# Altium footprint library common.PcbLib: 552 footprints (part 14 of 35)
Each footprint in its own frame and in the unit in brackets; x right, y up, seen from the top. Pads: shape width x height; smd on the part's side, far side on the other; paste and mask are expansions set on the pad; w line width, h text height; cw(c..) or ccw(c..) is an arc to the next point about the centre after c.
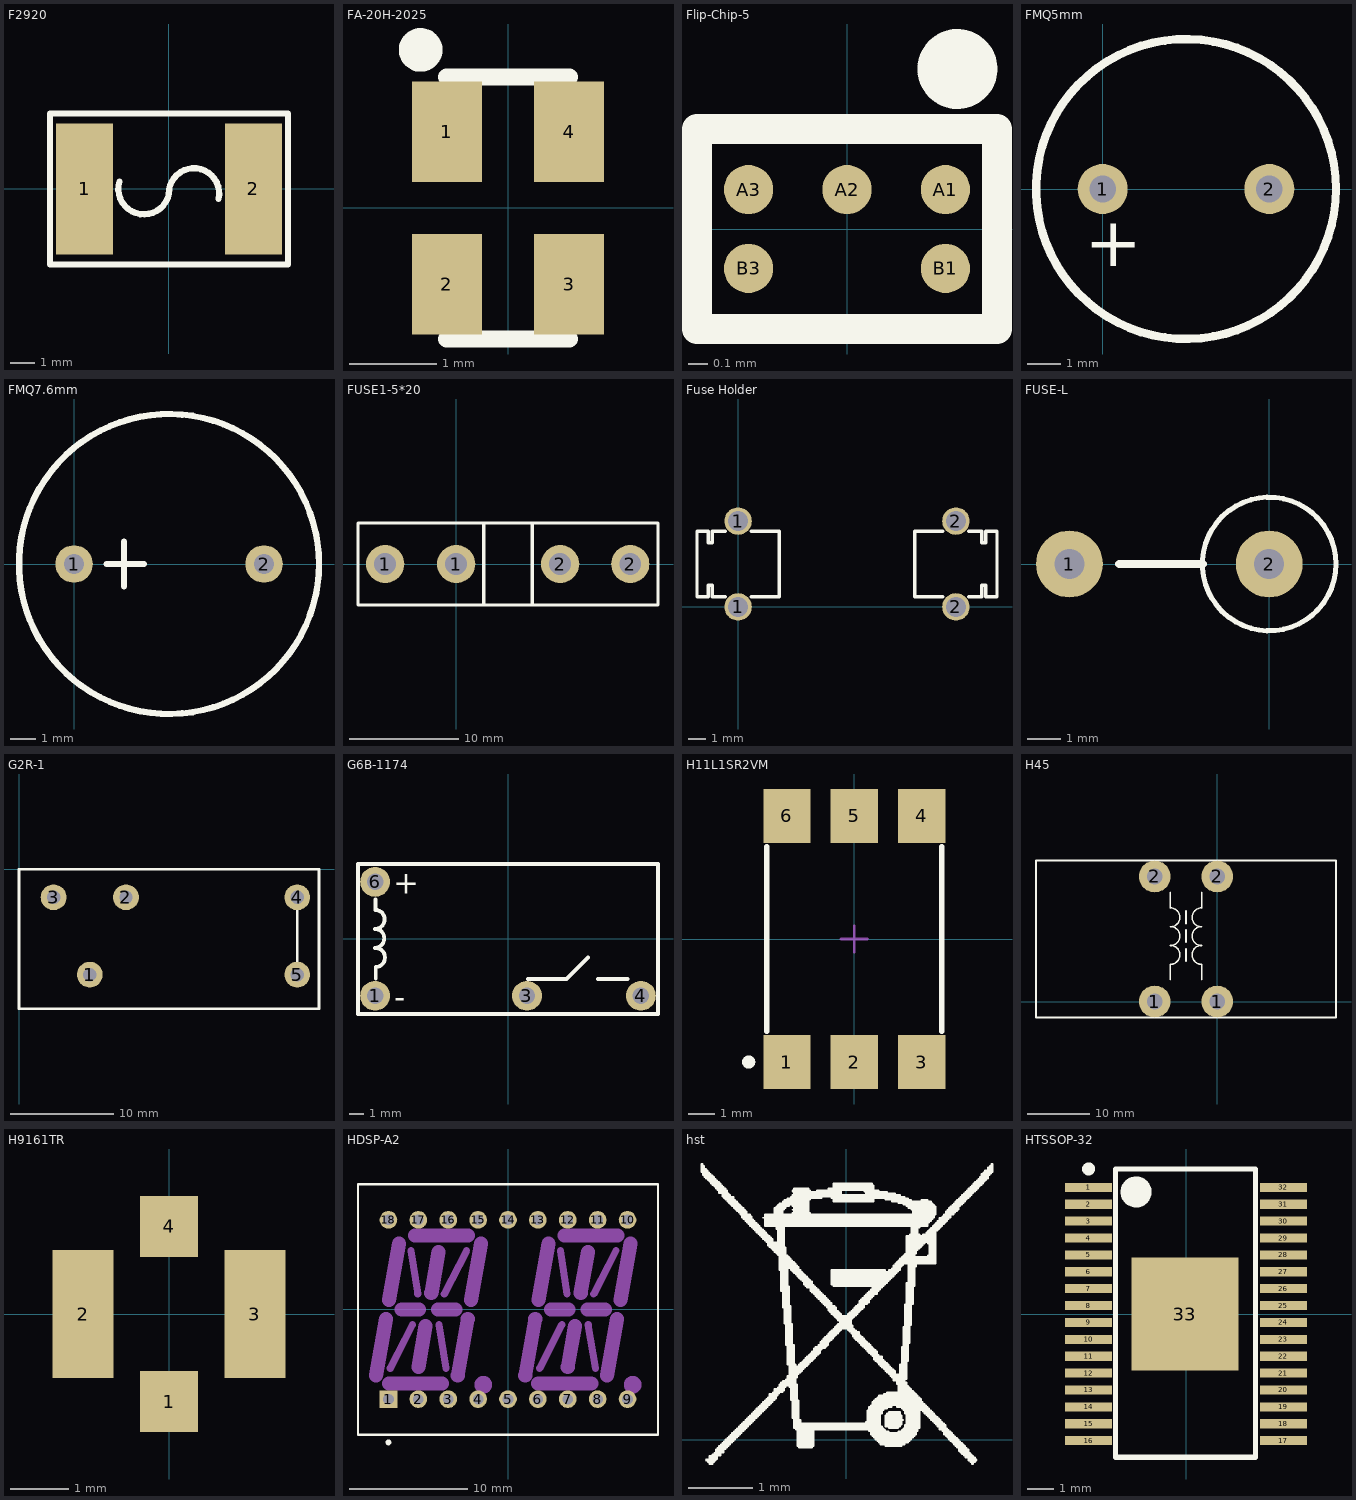
[diagram p13: the footprints below, top view; thin cyan lines are the x and y axes]

## F2920 [mm] "7452"
pads (2):
  rect 2.3x5.3 smd: 1(-3.4,0) 2(3.4,0)
Top Overlay:
  lines w0.254: -2,0.3 ccw(c-1.012,0.007) 0.018,0 ; -0.009,-0.2 cw(c1.008,-0.178) 2,-0.4 ; -4.8,-3.048 -4.8,3.048 4.8,3.048 4.8,-3.048 -4.8,-3.048
3D body: height 1, standoff 0, extent -2.878,-2.718 3.18,2.667
3D body: height 1, standoff 0, extent -3.576,-2.718 -2.878,2.667
3D body: height 1, standoff 0, extent 2.7,-2.692 3.399,2.692

## FA-20H-2025 [mm]
height 0.5
pads (4):
  rect 0.8x1.15 smd: 1(-0.7,0.875) 2(-0.7,-0.875) 3(0.7,-0.875) 4(0.7,0.875)
Top Overlay:
  circle w0.25: c-1,1.81 r0.125
  lines w0.2: -0.7,-1.5 0.7,-1.5 ; -0.7,1.5 0.7,1.5
3D body: height 0.5, standoff 0, extent -1.005,-1.25 0.995,1.25

## Flip-Chip-5 [mm]
height 0.69
pads (5):
  round 0.25 smd mask+0.05: A1(0.5,0.2) A2(0,0.2) A3(-0.5,0.2) B1(0.5,-0.2) B3(-0.5,-0.2)
Top Overlay:
  circle w0.203: c0.561,0.813 r0.102
  lines w0.152: -0.762,-0.508 -0.762,0.508 0.762,0.508 0.762,-0.508 -0.762,-0.508
3D body: height 0.69, standoff 0, extent -0.693,-0.425 0.693,0.43

## FMQ5mm [mm]
pads (2):
  round 1.5 hole 0.8: 1(0,0) 2(5,0)
Top Overlay:
  circle w0.254: c2.5,0 r4.5
  text "+" at -0.533,-2.311 h1.5
3D body: height 4.5, standoff -4.5, extent -2,-4.5 7,4.5

## FMQ7.6mm [mm]
pads (2):
  round 1.5 hole 0.8: 1(0,0) 2(7.6,0)
Top Overlay:
  circle w0.254: c3.799,0 r6.001
  lines w0.254: 1.3,0 2.8,0 ; 2,-0.9 2,0.9
3D body: height 9.65, standoff -4.5, extent -5.727,-6 9.727,6

## FUSE1-5*20 [mil]
pads (4):
  round 138 hole 79: 1(-256,0) 1(0,0) 2(375,0) 2(628,0)
Top Overlay:
  lines w12: 99,-148 99,148 ; 274,-148 274,148 ; -354,-148 728,-148 728,148 -354,148 -354,-148
3D body: height 374.02, standoff -155.51, extent -215.67,-115 575.67,117.58

## Fuse Holder [mm]
pads (4):
  round 1.6 hole 1.17 mask+0.06: 1(0,0) 1(0,5) 2(12.7,0) 2(12.7,5)
Top Overlay:
  lines w0.2: -0.75,0.6 -1.5,0.6 -1.5,1.25 -1.75,1.25 -1.75,0.6 -2.4,0.6 -2.4,4.4 -1.75,4.4 -1.75,3.75 -1.5,3.75 -1.5,4.4 -0.75,4.4 ; 0.75,0.6 2.4,0.6 2.4,4.4 0.75,4.4 ; 11.95,0.6 10.3,0.6 10.3,4.4 11.95,4.4 ; 13.45,0.6 14.2,0.6 14.2,1.25 14.45,1.25 14.45,0.6 15.1,0.6 15.1,4.4 14.45,4.4 14.45,3.75 14.2,3.75 14.2,4.4 13.45,4.4
3D body: height 7.4, standoff -2.95, extent -2.275,0 2.525,5.1
3D body: height 7.4, standoff -2.95, extent 10.325,0 15.125,5.1

## FUSE-L [mil]
height 511.81
pads (2):
  round 79 hole 35.43: 1(-236.22,0) 2(0,0)
Top Overlay:
  circle w6: c0,0 r79
  lines w10: -177.17,0 -78.74,0
3D body: height 545.04, standoff -77.66, extent -249.02,-74.21 77.68,83.27

## G2R-1 [mm]
pads (5):
  round 2.5 hole 1.3: 1(6.858,-10.211) 2(10.363,-2.718) 3(3.353,-2.718) 4(26.949,-2.718) 5(26.949,-10.211)
Top Overlay:
  lines w0.254: 26.949,-10.211 26.949,-2.718 ; 0,-13.513 29.058,-13.513 29.058,0 0,0 0,-13.513
3D body: height 25.5, standoff -4, extent 0.079,-13.583 29.08,-0.083

## G6B-1174 [mm]
pads (4):
  round 2 hole 1.1: 1(-8.89,-3.81) 3(1.27,-3.81) 4(8.89,-3.81) 6(-8.89,3.81)
Top Overlay:
  lines w0.254: -8.915,-0.61 ccw(c-8.915,0.025) -8.28,0.025 -8.28,0.051 ccw(c-8.89,0.051) -8.89,0.66 ccw(c-8.89,1.295) -8.255,1.295 -8.255,1.321 ccw(c-8.865,1.321) -8.865,1.93 -8.865,2.642 ; -8.865,-0.61 cw(c-8.865,-1.245) -8.23,-1.245 -8.23,-1.27 cw(c-8.839,-1.27) -8.839,-1.88 -8.839,-2.667 ; 1.346,-2.692 3.912,-2.692 5.359,-1.245 ; 6.02,-2.692 8.001,-2.692 ; -10.033,-5.029 10.033,-5.029 10.033,5.004 -10.033,5.004 -10.033,-5.029
  text "+" at -7.671,3.023 h1.52
  text "-" at -7.62,-4.648 h1.52
3D body: height 10, standoff -3.2, extent -10.474,-5 10.526,5

## H11L1SR2VM [mil] "Recommended pad layout for surface mount leadform"
height 200
pads (6):
  rect 70x80 smd: 1(-100,-182.48) 2(0,-182.48) 3(100,-182.48) 4(100,182.48) 5(0,182.48) 6(-100,182.48)
Top Overlay:
  circle w9.84: c-156.69,-182.48 r4.92
  lines w7.87: -129.92,-136.81 -129.92,136.81 ; 129.92,-136.81 129.92,136.81
Mechanical 15:
  lines w3.94: -19.69,0 19.68,0 ; 0,-19.68 0,19.68
3D body: height 156.56, standoff -1.58, extent -173.88,-196 175.88,189.83

## H45 [mm]
pads (4):
  round 5.08 hole 2.54: 1(-10,0) 1(0,0) 2(-10,20) 2(0,20)
Top Overlay:
  lines w0.254: -7.511,3.48 -7.511,5.969 ; -7.511,5.944 ccw(c-7.511,7.468) -7.511,8.992 ; -7.511,8.941 ccw(c-7.511,10.465) -7.511,11.989 ; -7.511,11.938 ccw(c-7.511,13.462) -7.511,14.986 ; -7.511,14.961 -7.511,17.475 ; -4.996,6.477 -4.996,8.458 ; -4.996,9.474 -4.996,11.455 ; -4.996,12.471 -4.996,14.478 ; -2.507,3.454 -2.507,5.944 cw(c-2.507,7.468) -2.507,8.992 ; -2.507,8.941 cw(c-2.507,10.465) -2.507,11.989 ; -2.507,11.938 cw(c-2.507,13.462) -2.507,14.986 ; -2.507,14.961 -2.507,17.475
  lines w0.305: -29,-2.54 -29,22.54 19,22.54 19,-2.54 -29,-2.54
3D body: height 44.34, standoff -1.96, extent -27.051,-1.397 16.129,21.463

## H9161TR [mm] "U.FL/IPX ANTENNA CONNECTOR"
pads (4):
  rect 1x1.05 smd: 1(0,-1.502) 4(0,1.502)
  rect 1.05x2.2 smd: 2(-1.475,0) 3(1.475,0)
3D body: height 1.25, standoff -0.01, extent -1.499,-1.626 1.501,1.474

## HDSP-A2 [mm] "LED, Alphanumeric Display, 13.8 mm, Dual Character; 18 Leads; Row Space 15.24 mm; Pitch 2.54 mm"
height 7.27
pads (18):
  rect 1.5x1.5 hole 0.9: 1(-10.16,-7.62)
  round 1.5 hole 0.9: 2(-7.62,-7.62) 3(-5.08,-7.62) 4(-2.54,-7.62) 5(0,-7.62) 6(2.54,-7.62) 7(5.08,-7.62) 8(7.62,-7.62) 9(10.16,-7.62) 10(10.16,7.62) 11(7.62,7.62) 12(5.08,7.62) 13(2.54,7.62) 14(0,7.62) 15(-2.54,7.62) 16(-5.08,7.62) 17(-7.62,7.62) 18(-10.16,7.62)
Top Overlay:
  circle w0.25: c-10.16,-11.3 r0.125
  lines w0.2: -12.75,-10.65 -12.75,10.65 12.75,10.65 12.75,-10.65 -12.75,-10.65
Mechanical 2:
  circle w1.2: c10.6,-6.4 r0.15
  circle w1.2: c-2.1,-6.4 r0.15
  lines w0.6: -10.01,-5 -8.12,-1.3 ; -8.25,5 -7.67,1.3 ; -5.88,-1.3 -5.28,-5 ; -5.42,1.3 -3.52,5 ; 2.69,-5 4.58,-1.3 ; 4.45,5 5.03,1.3 ; 6.82,-1.3 7.42,-5 ; 7.28,1.3 9.18,5
  lines w1.2: -11.23,-5.6 -10.38,-0.8 ; -10.13,-6.3 -5.62,-6.3 ; -10.1,0.8 -9.26,5.58 ; -9.035,0 -7.58,0 ; -7.9,6.3 -3.39,6.3 ; -7.62,-4.89 -7.01,-1.4 ; -6.52,1.41 -5.91,4.89 ; -5.96,0 -4.465,0 ; -4.27,-5.6 -3.42,-0.8 ; -3.13,0.81 -2.3,5.59 ; 1.47,-5.6 2.32,-0.8 ; 2.57,-6.3 7.08,-6.3 ; 2.6,0.8 3.44,5.58 ; 3.665,0 5.14,0 ; 4.8,6.3 9.31,6.3 ; 5.08,-4.89 5.69,-1.4 ; 6.18,1.41 6.79,4.89 ; 6.76,0 8.235,0 ; 8.43,-5.6 9.28,-0.8 ; 9.57,0.81 10.4,5.59
3D body: height 10, standoff 0, extent -12.164,-9.373 11.836,9.627

## hst [mm]
Top Overlay:
  drawing of 1279 lines, arcs and shapes, not listed

## HTSSOP-32 [mm]
pads (33):
  rect 1.8x0.35 smd: 1(-3.75,4.875) 2(-3.75,4.225) 3(-3.75,3.575) 4(-3.75,2.925) 5(-3.75,2.275) 6(-3.75,1.625) 7(-3.75,0.975) 8(-3.75,0.325) 9(-3.75,-0.325) 10(-3.75,-0.975) 11(-3.75,-1.625) 12(-3.75,-2.275) 13(-3.75,-2.925) 14(-3.75,-3.575) 15(-3.75,-4.225) 16(-3.75,-4.875) 17(3.75,-4.875) 18(3.75,-4.225) 19(3.75,-3.575) 20(3.75,-2.925) 21(3.75,-2.275) 22(3.75,-1.625) 23(3.75,-0.975) 24(3.75,-0.325) 25(3.75,0.325) 26(3.75,0.975) 27(3.75,1.625) 28(3.75,2.275) 29(3.75,2.925) 30(3.75,3.575) 31(3.75,4.225) 32(3.75,4.875)
  rect 4.11x4.36 smd: 33(-0.042,-0.002)
Top Overlay:
  circle w0.25: c-3.75,5.586 r0.125
  circle w0.6: c-1.921,4.697 r0.3
  lines w0.2: -2.709,-5.514 2.676,-5.514 2.676,5.586 -2.709,5.586 -2.709,-5.514
3D body: height 1.1, standoff 0, extent -4.052,-5.476 4.048,5.624